# Altium footprint library En.PcbLib: 157 footprints (part 8 of 10)
Each footprint in its own frame and in the unit in brackets; x right, y up, seen from the top. Pads: shape width x height; smd on the part's side, far side on the other; paste and mask are expansions set on the pad; w line width, h text height; cw(c..) or ccw(c..) is an arc to the next point about the centre after c.
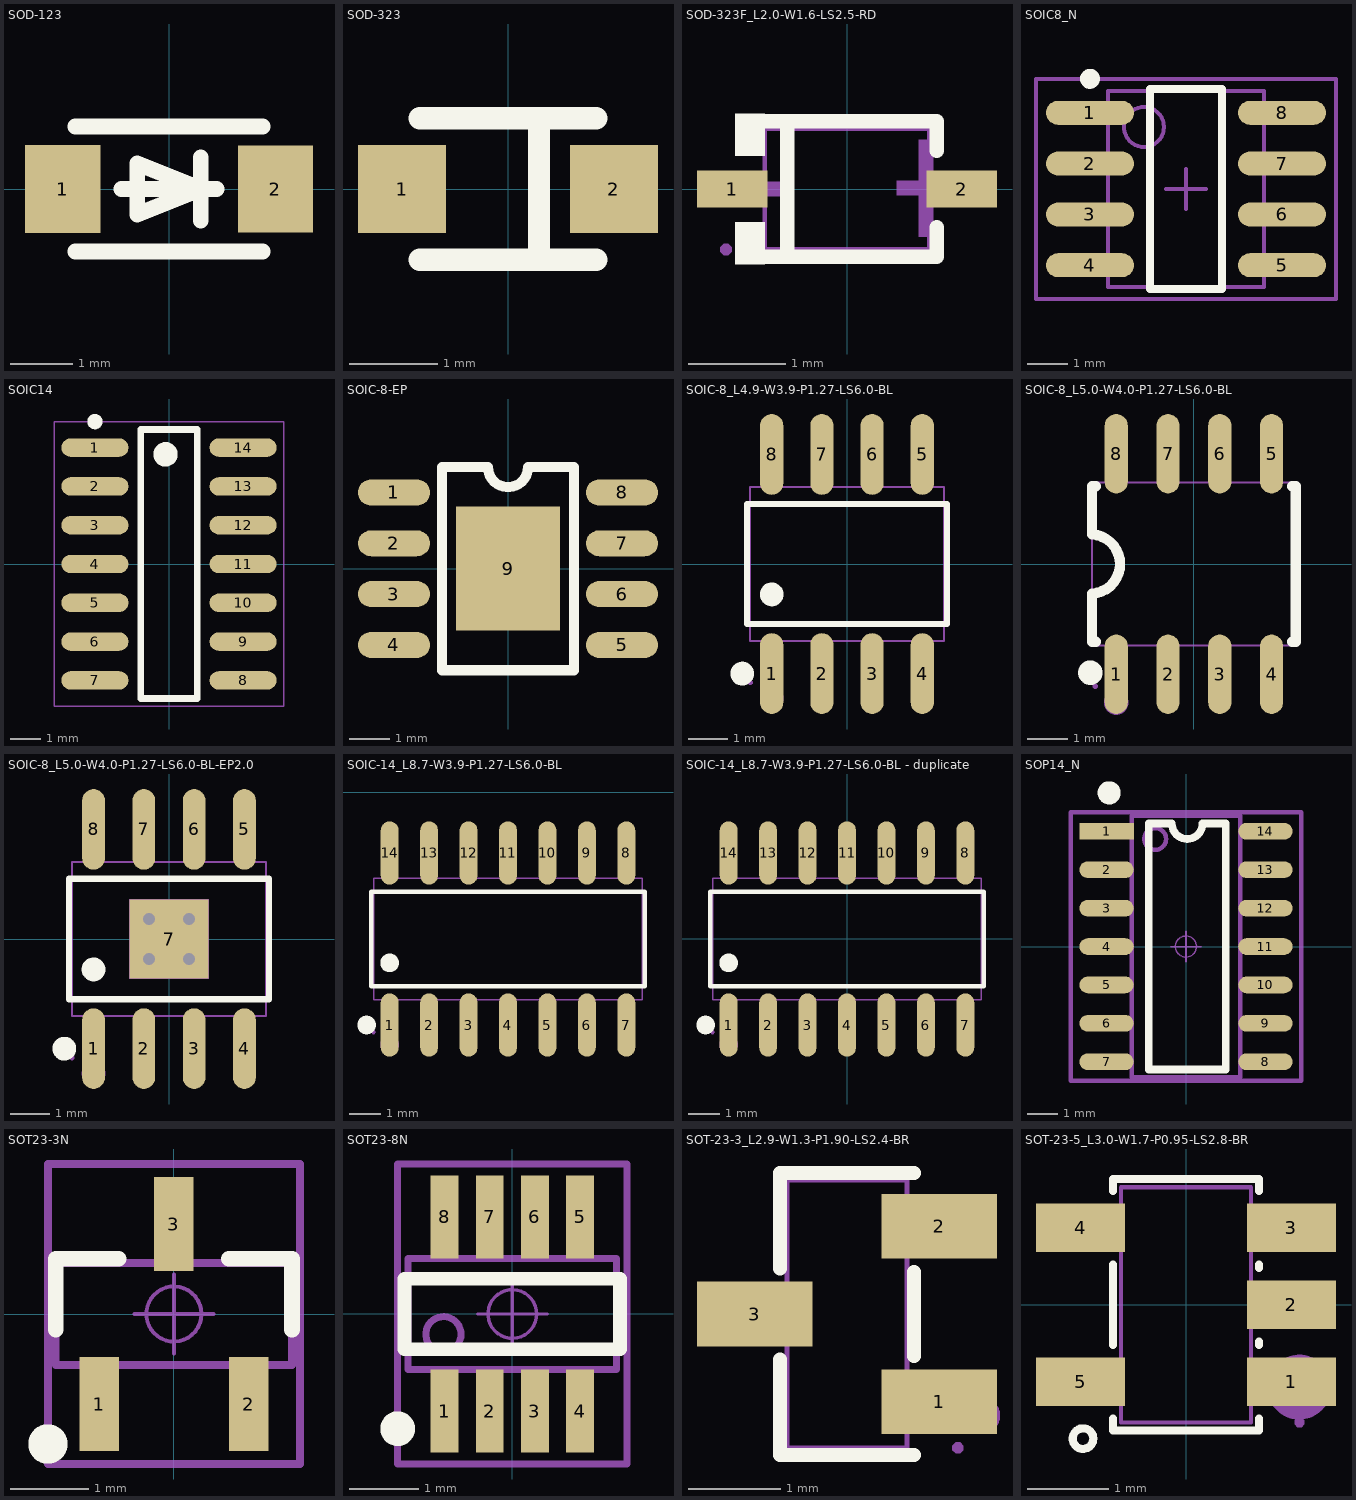
[diagram p7: the footprints below, top view; thin cyan lines are the x and y axes]

## SOD-123 [mm]
pads (2):
  rect 1.2x1.4 smd: 1(-1.7,0) 2(1.7,0)
Top Overlay:
  lines w0.254: -1.5,-1 1.5,-1 ; -1.5,1 1.5,1 ; -0.762,0 0.762,0 ; 0.508,-0.508 0.508,0.508 ; -0.508,-0.406 -0.508,0.406 0.508,0 -0.508,-0.406
3D body "User Library-SOD123-1.STEP": height 1.18, standoff 0, extent -1.95,-0.9 1.95,0.9

## SOD-323 [mm]
height 9.4
pads (2):
  rect 1x1 smd: 1(-1.2,0) 2(1.2,0)
Top Overlay:
  lines w0.254: -1,-0.8 1,-0.8 ; -1,0.8 1,0.8 ; 0.351,-0.8 0.351,0.8
3D body "SOD-323.STEP": height 1, standoff 0, extent -1.312,-0.667 1.288,0.633

## SOD-323F_L2.0-W1.6-LS2.5-RD [mm]
pads (2):
  rect 0.73x0.385 smd: 1(-1.185,0) 2(1.185,0)
Top Overlay:
  region: -0.85,0.777 -0.85,0.345 -1.155,0.345 -1.155,0.777
  region: -0.85,-0.777 -0.85,-0.345 -1.155,-0.345 -1.155,-0.777
  lines w0.152: -0.926,-0.701 0.926,-0.701 0.926,-0.396 ; -0.926,0.701 0.926,0.701 0.926,0.396 ; -0.617,-0.701 -0.617,0.701
Mechanical 6:
  region: -1.189,0.075 -1.189,-0.075 -0.589,-0.075 -0.589,0.075
  region: 1.114,0.083 1.114,-0.067 0.514,-0.067 0.514,0.083
  region: 0.889,0.508 0.889,-0.492 0.739,-0.492 0.739,0.508
Mechanical 15:
  region: -1.19,-0.625 -1.19,-0.601 -1.225,-0.566 -1.274,-0.566 -1.309,-0.601 -1.31,-0.625 -1.309,-0.649 -1.274,-0.684 -1.225,-0.684 -1.19,-0.65
  region: -1.25,-0.163 -1.25,0.163 -0.85,0.163 -0.85,-0.163
  region: 1.25,-0.163 1.25,0.163 0.85,0.163 0.85,-0.163
  lines w0.051: -0.85,-0.625 -0.85,0.625 0.85,0.625 0.85,-0.625 -0.85,-0.625
3D body "bat46wj,115.step": height 1.12, standoff -0.03, extent -1.353,-0.65 1.353,0.65

## SOIC8_N [mm]
pads (8):
  oval 2.2x0.6 smd: 1(3.442,-7.747) 2(3.442,-9.017) 3(3.442,-10.287) 4(3.442,-11.557) 5(8.242,-11.557) 6(8.242,-10.287) 7(8.242,-9.017) 8(8.242,-7.747)
Top Overlay:
  circle w0.25: c3.442,-6.897 r0.125
  lines w0.2: 4.942,-12.152 4.942,-7.152 6.742,-7.152 6.742,-12.152 4.942,-12.152
Mechanical 13:
  circle w0.1: c4.792,-8.102 r0.5
  lines w0.1: 3.892,-12.102 3.892,-7.202 7.792,-7.202 7.792,-12.102 3.892,-12.102
Mechanical 15:
  lines w0.1: 5.342,-9.652 6.342,-9.652 ; 5.842,-10.152 5.842,-9.152 ; 2.092,-12.402 2.092,-6.902 9.592,-6.902 9.592,-12.402 2.092,-12.402
3D body "User Library-SOIC-8-1 (1).SLDPRT": height 1.75, standoff 0, extent 2.842,-12.102 8.842,-7.202

## SOIC14 [mm]
pads (14):
  oval 2.2x0.6 smd: 1(-2.425,3.81) 2(-2.425,2.54) 3(-2.425,1.27) 4(-2.425,0) 5(-2.425,-1.27) 6(-2.425,-2.54) 7(-2.425,-3.81) 8(2.425,-3.81) 9(2.425,-2.54) 10(2.425,-1.27) 11(2.425,0) 12(2.425,1.27) 13(2.425,2.54) 14(2.425,3.81)
Top Overlay:
  circle w0.25: c-2.425,4.66 r0.125
  circle w0.4: c-0.115,3.59 r0.2
  lines w0.22: -0.925,-4.4 -0.925,4.4 0.925,4.4 0.925,-4.4 -0.925,-4.4
Mechanical 15:
  lines w0.05: -3.75,-4.65 -3.75,4.65 3.75,4.65 3.75,-4.65 -3.75,-4.65
3D body "SOIC14.STEP": height 1.75, standoff 0, extent -2.896,-4.237 2.904,4.293

## SOIC-8-EP [mm]
pads (9):
  oval 1.8x0.65 smd: 1(-2.85,1.905) 2(-2.85,0.635) 3(-2.85,-0.635) 4(-2.85,-1.905) 5(2.85,-1.905) 6(2.85,-0.635) 7(2.85,0.635) 8(2.85,1.905)
  rect 2.6x3.1 smd: 9(0,0)
Top Overlay:
  lines w0.254: 0.5,2.54 cw(c0,2.54) -0.5,2.54 -1.651,2.54 -1.651,-2.54 1.651,-2.54 1.651,2.54 0.508,2.54
3D body "ESOP8.STEP": height 1.53, standoff -0.01, extent -3.003,-2.5 3.003,2.5

## SOIC-8_L4.9-W3.9-P1.27-LS6.0-BL [mm]
pads (8):
  oval 0.588x2.045 smd mask+0.051: 1(-1.905,-2.772) 2(-0.635,-2.772) 3(0.635,-2.772) 4(1.905,-2.772) 5(1.905,2.772) 6(0.635,2.772) 7(-0.635,2.772) 8(-1.905,2.772)
Top Overlay:
  circle w0.3: c-1.905,-0.769 r0.15
  circle w0.3: c-2.652,-2.772 r0.15
  lines w0.152: -2.526,-1.521 -2.526,1.521 2.526,1.521 2.526,-1.521 -2.526,-1.521
Mechanical 6:
  circle w0.3: c-1.905,-3.4 r0.15
Mechanical 15:
  region: -2.39,-3 -2.39,-2.975 -2.425,-2.94 -2.475,-2.94 -2.51,-2.975 -2.51,-3 -2.51,-3.025 -2.475,-3.06 -2.425,-3.06 -2.39,-3.025 -2.39,-3
  region: -2.115,-3 -2.115,-2.165 -1.695,-2.165 -1.695,-3
  region: -2.115,-2.175 -2.115,-1.94 -1.695,-1.94 -1.695,-2.175
  region: -0.845,-3 -0.845,-2.165 -0.425,-2.165 -0.425,-3
  region: -0.845,-2.175 -0.845,-1.94 -0.425,-1.94 -0.425,-2.175
  region: 0.425,-3 0.425,-2.165 0.845,-2.165 0.845,-3
  region: 0.425,-2.175 0.425,-1.94 0.845,-1.94 0.845,-2.175
  region: 1.695,-3 1.695,-2.165 2.115,-2.165 2.115,-3
  region: 1.695,-2.175 1.695,-1.94 2.115,-1.94 2.115,-2.175
  region: -2.115,3 -2.115,2.165 -1.695,2.165 -1.695,3
  region: -2.115,2.175 -2.115,1.94 -1.695,1.94 -1.695,2.175
  region: -0.845,3 -0.845,2.165 -0.425,2.165 -0.425,3
  region: -0.845,2.175 -0.845,1.94 -0.425,1.94 -0.425,2.175
  region: 0.425,3 0.425,2.165 0.845,2.165 0.845,3
  region: 0.425,2.175 0.425,1.94 0.845,1.94 0.845,2.175
  region: 1.695,3 1.695,2.165 2.115,2.165 2.115,3
  region: 1.695,2.175 1.695,1.94 2.115,1.94 2.115,2.175
  lines w0.051: -2.45,-1.95 -2.45,1.95 2.45,1.95 2.45,-1.95 -2.45,-1.95
3D body "User Library-SOIC-8-1 (1).SLDPRT": height 1.75, standoff 0, extent -2.45,-3 2.45,3

## SOIC-8_L5.0-W4.0-P1.27-LS6.0-BL [mil]
pads (8):
  oval 22.38x76.78 smd: 1(-75,-106.5) 2(-25,-106.5) 3(25,-106.5) 4(75,-106.5) 5(75,106.5) 6(25,106.5) 7(-25,106.5) 8(-75,106.5)
Top Overlay:
  circle w11.81: c-100,-105 r5.91
  lines w10: -98.43,-28.61 ccw(c-99.99,0) -98.23,28.59 ; -98.42,-28.61 -98.42,-59.05 -98.42,-75 -94.83,-75 ; -98.42,28.59 -98.42,59.05 -98.42,75 -94.83,75 ; 94.83,-75 98.42,-75 98.42,-59.05 98.42,59.05 98.42,75 94.83,75
Mechanical 6:
  circle w11.81: c-75,-133.86 r5.91
Mechanical 15:
  region: -83.07,-118.11 -83.07,-85.24 -66.93,-85.24 -66.93,-118.11
  region: -83.07,-85.63 -83.07,-76.38 -66.93,-76.38 -66.93,-85.63
  region: -33.07,-118.11 -33.07,-85.24 -16.93,-85.24 -16.93,-118.11
  region: -33.07,-85.63 -33.07,-76.38 -16.93,-76.38 -16.93,-85.63
  region: 16.93,-118.11 16.93,-85.24 33.07,-85.24 33.07,-118.11
  region: 16.93,-85.63 16.93,-76.38 33.07,-76.38 33.07,-85.63
  region: 66.93,-118.11 66.93,-85.24 83.07,-85.24 83.07,-118.11
  region: 66.93,-85.63 66.93,-76.38 83.07,-76.38 83.07,-85.63
  region: -83.07,85.24 -83.07,118.11 -66.93,118.11 -66.93,85.24
  region: -83.07,76.38 -83.07,85.63 -66.93,85.63 -66.93,76.38
  region: -33.07,85.24 -33.07,118.11 -16.93,118.11 -16.93,85.24
  region: -33.07,76.38 -33.07,85.63 -16.93,85.63 -16.93,76.38
  region: 16.93,85.24 16.93,118.11 33.07,118.11 33.07,85.24
  region: 16.93,76.38 16.93,85.63 33.07,85.63 33.07,76.38
  region: 66.93,85.24 66.93,118.11 83.07,118.11 83.07,85.24
  region: 66.93,76.38 66.93,85.63 83.07,85.63 83.07,76.38
  region: -92.92,-118.11 -92.94,-117.15 -94.32,-115.8 -96.24,-115.8 -97.62,-117.15 -97.64,-118.11 -97.62,-119.07 -96.24,-120.42 -94.32,-120.42 -92.94,-119.07
  lines w2: -98.42,-78.74 98.42,-78.74 98.42,78.74 -98.42,78.74 -98.42,-78.74
3D body "User Library-SOIC-8-1 (1).SLDPRT": height 68.9, standoff 0, extent -96.46,-118.11 96.46,118.11

## SOIC-8_L5.0-W4.0-P1.27-LS6.0-BL-EP2.0 [mm]
pads (9):
  oval 0.574x2.038 smd: 1(-1.905,-2.769) 2(-0.635,-2.769) 3(0.635,-2.769) 4(1.905,-2.769) 5(1.905,2.769) 6(0.635,2.769) 7(-0.635,2.769) 8(-1.905,2.769)
  rect 2x2 smd: 7(0,0)
via 0.5,-0.5 diameter 0.61 hole 0.305
via -0.5,-0.5 diameter 0.61 hole 0.305
via -0.5,0.5 diameter 0.61 hole 0.305
via 0.5,0.5 diameter 0.61 hole 0.305
Top Overlay:
  circle w0.3: c-2.644,-2.769 r0.15
  circle w0.3: c-1.905,-0.769 r0.15
  lines w0.152: -2.526,-1.521 2.526,-1.521 2.526,1.521 -2.526,1.521 -2.526,-1.521
Mechanical 6:
  circle w0.3: c-1.905,-3.4 r0.15
Mechanical 15:
  region: -1,-1 -1,1 1,1 1,-1
  region: 1.7,2.175 1.7,1.94 2.11,1.94 2.11,2.175
  region: 1.7,3 1.7,2.165 2.11,2.165 2.11,3
  region: 0.43,2.175 0.43,1.94 0.84,1.94 0.84,2.175
  region: 0.43,3 0.43,2.165 0.84,2.165 0.84,3
  region: -0.84,2.175 -0.84,1.94 -0.43,1.94 -0.43,2.175
  region: -0.84,3 -0.84,2.165 -0.43,2.165 -0.43,3
  region: -2.11,2.175 -2.11,1.94 -1.7,1.94 -1.7,2.175
  region: -2.11,3 -2.11,2.165 -1.7,2.165 -1.7,3
  region: 1.7,-2.175 1.7,-1.94 2.11,-1.94 2.11,-2.175
  region: 1.7,-3 1.7,-2.165 2.11,-2.165 2.11,-3
  region: 0.43,-2.175 0.43,-1.94 0.84,-1.94 0.84,-2.175
  region: 0.43,-3 0.43,-2.165 0.84,-2.165 0.84,-3
  region: -0.84,-2.175 -0.84,-1.94 -0.43,-1.94 -0.43,-2.175
  region: -0.84,-3 -0.84,-2.165 -0.43,-2.165 -0.43,-3
  region: -2.11,-2.175 -2.11,-1.94 -1.7,-1.94 -1.7,-2.175
  region: -2.11,-3 -2.11,-2.165 -1.7,-2.165 -1.7,-3
  region: -2.39,-3 -2.391,-2.976 -2.426,-2.941 -2.475,-2.941 -2.51,-2.975 -2.51,-3 -2.51,-3.024 -2.475,-3.059 -2.426,-3.059 -2.391,-3.024
  lines w0.051: -2.45,-1.95 2.45,-1.95 2.45,1.95 -2.45,1.95 -2.45,-1.95
3D body "User Library-SOIC-8-1 (1).SLDPRT": height 1.75, standoff 0, extent -2.45,-3 2.45,3

## SOIC-14_L8.7-W3.9-P1.27-LS6.0-BL [mm]
pads (14):
  oval 0.574x2.038 smd: 1(46.483,-7.49) 2(47.753,-7.49) 3(49.023,-7.49) 4(50.293,-7.49) 5(51.563,-7.49) 6(52.833,-7.49) 7(54.103,-7.49) 8(54.103,-1.952) 9(52.833,-1.952) 10(51.563,-1.952) 11(50.293,-1.952) 12(49.023,-1.952) 13(47.753,-1.952) 14(46.483,-1.952)
Top Overlay:
  circle w0.3: c46.483,-5.49 r0.15
  circle w0.3: c45.743,-7.49 r0.15
  lines w0.152: 45.891,-6.242 45.891,-3.199 54.694,-3.199 54.694,-6.242 45.891,-6.242
Mechanical 6:
  circle w0.3: c46.483,-8.121 r0.15
Mechanical 15:
  drawing of 33 lines, arcs and shapes, not listed
3D body "SOIC14.STEP": height 1.75, standoff 0, extent 45.999,-7.722 54.529,-1.922

## SOIC-14_L8.7-W3.9-P1.27-LS6.0-BL - duplicate [mm]
pads (14):
  oval 0.574x2.038 smd: 1(-3.81,-2.769) 2(-2.54,-2.769) 3(-1.27,-2.769) 4(0,-2.769) 5(1.27,-2.769) 6(2.54,-2.769) 7(3.81,-2.769) 8(3.81,2.769) 9(2.54,2.769) 10(1.27,2.769) 11(0,2.769) 12(-1.27,2.769) 13(-2.54,2.769) 14(-3.81,2.769)
Top Overlay:
  circle w0.3: c-4.549,-2.769 r0.15
  circle w0.3: c-3.81,-0.769 r0.15
  lines w0.152: -4.401,-1.521 4.401,-1.521 4.401,1.521 -4.401,1.521 -4.401,-1.521
Mechanical 6:
  circle w0.3: c-3.81,-3.4 r0.15
Mechanical 15:
  drawing of 33 lines, arcs and shapes, not listed

## SOP14_N [mm] "8.7*6.2*1.8mm（长宽高）"
height 9.4
pads (14):
  rect 1.8x0.55 smd: 1(-2.625,3.81)
  oval 1.8x0.55 smd: 2(-2.625,2.54) 3(-2.625,1.27) 4(-2.625,0) 5(-2.625,-1.27) 6(-2.625,-2.54) 7(-2.625,-3.81) 8(2.625,-3.81) 9(2.625,-2.54) 10(2.625,-1.27) 11(2.625,0) 12(2.625,1.27) 13(2.625,2.54) 14(2.625,3.81)
Top Overlay:
  circle w0.508: c-2.54,5.08 r0.127
  lines w0.254: -1.23,-4.064 -1.23,4.064 -0.468,4.064 ccw(c0.04,4.064) 0.04,3.556 ccw(c0.04,4.064) 0.548,4.064 1.31,4.064 1.31,-4.064 -1.23,-4.064
Mechanical 13:
  circle w0.15: c-1.016,3.556 r0.359
  lines w0.15: -1.8,-4.318 -1.8,4.318 1.8,4.318 1.8,-4.318 -1.8,-4.318
Mechanical 15:
  circle w0.05: c0,0 r0.35
  lines w0.05: -0.5,0 0.5,0 ; 0,-0.5 0,0.5
  lines w0.15: -3.81,-4.445 3.81,-4.445 3.81,4.445 -3.81,4.445 -3.81,-4.445
3D body "SOP14.STEP": height 1.9, standoff 0, extent -3.003,-4.35 3.003,4.35

## SOT23-3N [mm] "3x1.3x1mm(长宽高)"
height 1.1
pads (3):
  rect 0.5x1.2 smd: 1(-0.95,-1.143) 2(0.95,-1.143) 3(0,1.143)
Top Overlay:
  circle w0.25: c-1.6,-1.651 r0.125
  lines w0.2: -1.501,-0.2 -1.501,0.7 -0.701,0.7 ; 0.699,0.7 1.499,0.7 1.499,-0.2
Mechanical 13:
  lines w0.1: -1.5,-0.65 -1.5,0.65 1.5,0.65 1.5,-0.65 -1.5,-0.65
Mechanical 15:
  circle w0.05: c0,0 r0.35
  lines w0.05: -0.5,0 0.5,0 ; 0,-0.5 0,0.5
  lines w0.1: -1.6,-1.905 -1.6,1.905 1.6,1.905 1.6,-1.905 -1.6,-1.905
3D body "SOT23-3.STEP": height 1.05, standoff 0, extent -1.5,-1.2 1.5,1.2

## SOT23-8N [mm] "3x1.6x1.1mm(长宽高)"
height 1.45
pads (8):
  rect 0.4x1.2 smd: 1(-0.975,-1.397) 2(-0.325,-1.397) 3(0.325,-1.397) 4(0.975,-1.397) 5(0.975,1.397) 6(0.325,1.397) 7(-0.325,1.397) 8(-0.975,1.397)
Top Overlay:
  circle w0.25: c-1.651,-1.651 r0.125
  lines w0.2: -1.55,-0.508 1.55,-0.508 1.55,0.508 -1.55,0.508 -1.55,-0.508
Mechanical 13:
  circle w0.1: c-0.992,-0.292 r0.254
  lines w0.1: -1.5,-0.8 -1.5,0.8 1.5,0.8 1.5,-0.8 -1.5,-0.8
Mechanical 15:
  circle w0.05: c0,0 r0.35
  lines w0.05: -0.5,0 0.5,0 ; 0,-0.5 0,0.5
  lines w0.1: -1.651,-2.159 -1.651,2.159 1.651,2.159 1.651,-2.159 -1.651,-2.159
3D body "SOT23-8.STEP": height 1.15, standoff 0, extent -1.5,-1.403 1.5,1.403

## SOT-23-3_L2.9-W1.3-P1.90-LS2.4-BR [mm]
pads (3):
  rect 1.25x0.7 smd: 1(6.562,-4.885) 2(6.562,-2.985) 3(4.562,-3.935)
Top Overlay:
  lines w0.152: 4.836,-4.429 4.836,-5.461 6.288,-5.461 ; 4.836,-3.44 4.836,-2.409 6.288,-2.409 ; 6.288,-4.39 6.288,-3.479
Mechanical 6:
  circle w0.2: c7.022,-5.035 r0.1
Mechanical 15:
  region: 6.822,-5.385 6.821,-5.36 6.786,-5.326 6.738,-5.326 6.703,-5.36 6.702,-5.385 6.703,-5.409 6.738,-5.443 6.786,-5.443 6.821,-5.409
  region: 6.202,-3.2 6.202,-2.77 6.472,-2.77 6.472,-3.2
  region: 6.462,-3.2 6.462,-2.77 6.762,-2.77 6.762,-3.2
  region: 6.202,-5.1 6.202,-4.67 6.472,-4.67 6.472,-5.1
  region: 6.462,-5.1 6.462,-4.67 6.762,-4.67 6.762,-5.1
  region: 4.652,-4.15 4.652,-3.72 4.922,-3.72 4.922,-4.15
  region: 4.362,-4.15 4.362,-3.72 4.662,-3.72 4.662,-4.15
  lines w0.051: 4.912,-5.385 4.912,-2.485 6.212,-2.485 6.212,-5.385 4.912,-5.385
3D body "User Library-SOT23-3.SLDPRT": height 1.3, standoff 0, extent 4.188,-5.387 6.988,-2.487

## SOT-23-5_L3.0-W1.7-P0.95-LS2.8-BR [mm]
pads (5):
  rect 1.1x0.6 smd: 1(1.3,-0.95) 2(1.3,0) 3(1.3,0.95) 4(-1.3,0.95) 5(-1.3,-0.95)
Top Overlay:
  circle w0.1: c-1.27,-1.651 r0.127
  lines w0.1: -0.9,-1.404 -0.9,-1.55 0.9,-1.55 0.9,-1.404 ; -0.9,-0.496 -0.9,0.496 ; -0.9,1.404 -0.9,1.55 0.9,1.55 0.9,1.404 ; 0.9,-0.496 0.9,-0.454 ; 0.9,0.454 0.9,0.496
Mechanical 6:
  circle w0.4: c1.397,-1.016 r0.2
Mechanical 15:
  region: -1.4,-1.15 -1.4,-0.75 -0.95,-0.75 -0.95,-1.15
  region: -0.96,-1.15 -0.96,-0.75 -0.79,-0.75 -0.79,-1.15
  region: -1.4,0.75 -1.4,1.15 -0.95,1.15 -0.95,0.75
  region: -0.96,0.75 -0.96,1.15 -0.79,1.15 -0.79,0.75
  region: 0.95,0.75 0.95,1.15 1.4,1.15 1.4,0.75
  region: 0.79,0.75 0.79,1.15 0.96,1.15 0.96,0.75
  region: 0.95,-0.2 0.95,0.2 1.4,0.2 1.4,-0.2
  region: 0.79,-0.2 0.79,0.2 0.96,0.2 0.96,-0.2
  region: 0.95,-1.15 0.95,-0.75 1.4,-0.75 1.4,-1.15
  region: 0.79,-1.15 0.79,-0.75 0.96,-0.75 0.96,-1.15
  region: 1.46,-1.45 1.46,-1.425 1.425,-1.39 1.375,-1.39 1.34,-1.425 1.34,-1.45 1.34,-1.475 1.375,-1.51 1.425,-1.51 1.46,-1.475
  lines w0.051: -0.8,-1.45 -0.8,1.45 0.8,1.45 0.8,-1.45 -0.8,-1.45
3D body "ALSRobot-SOT23-5R.SLDPRT": height 1.3, standoff 0, extent -1.5,-1.5 1.5,1.5